# Altium footprint library 430 integreted.PcbLib: 281 footprints (part 12 of 18)
Each footprint in its own frame and in the unit in brackets; x right, y up, seen from the top. Pads: shape width x height; smd on the part's side, far side on the other; paste and mask are expansions set on the pad; w line width, h text height; cw(c..) or ccw(c..) is an arc to the next point about the centre after c.
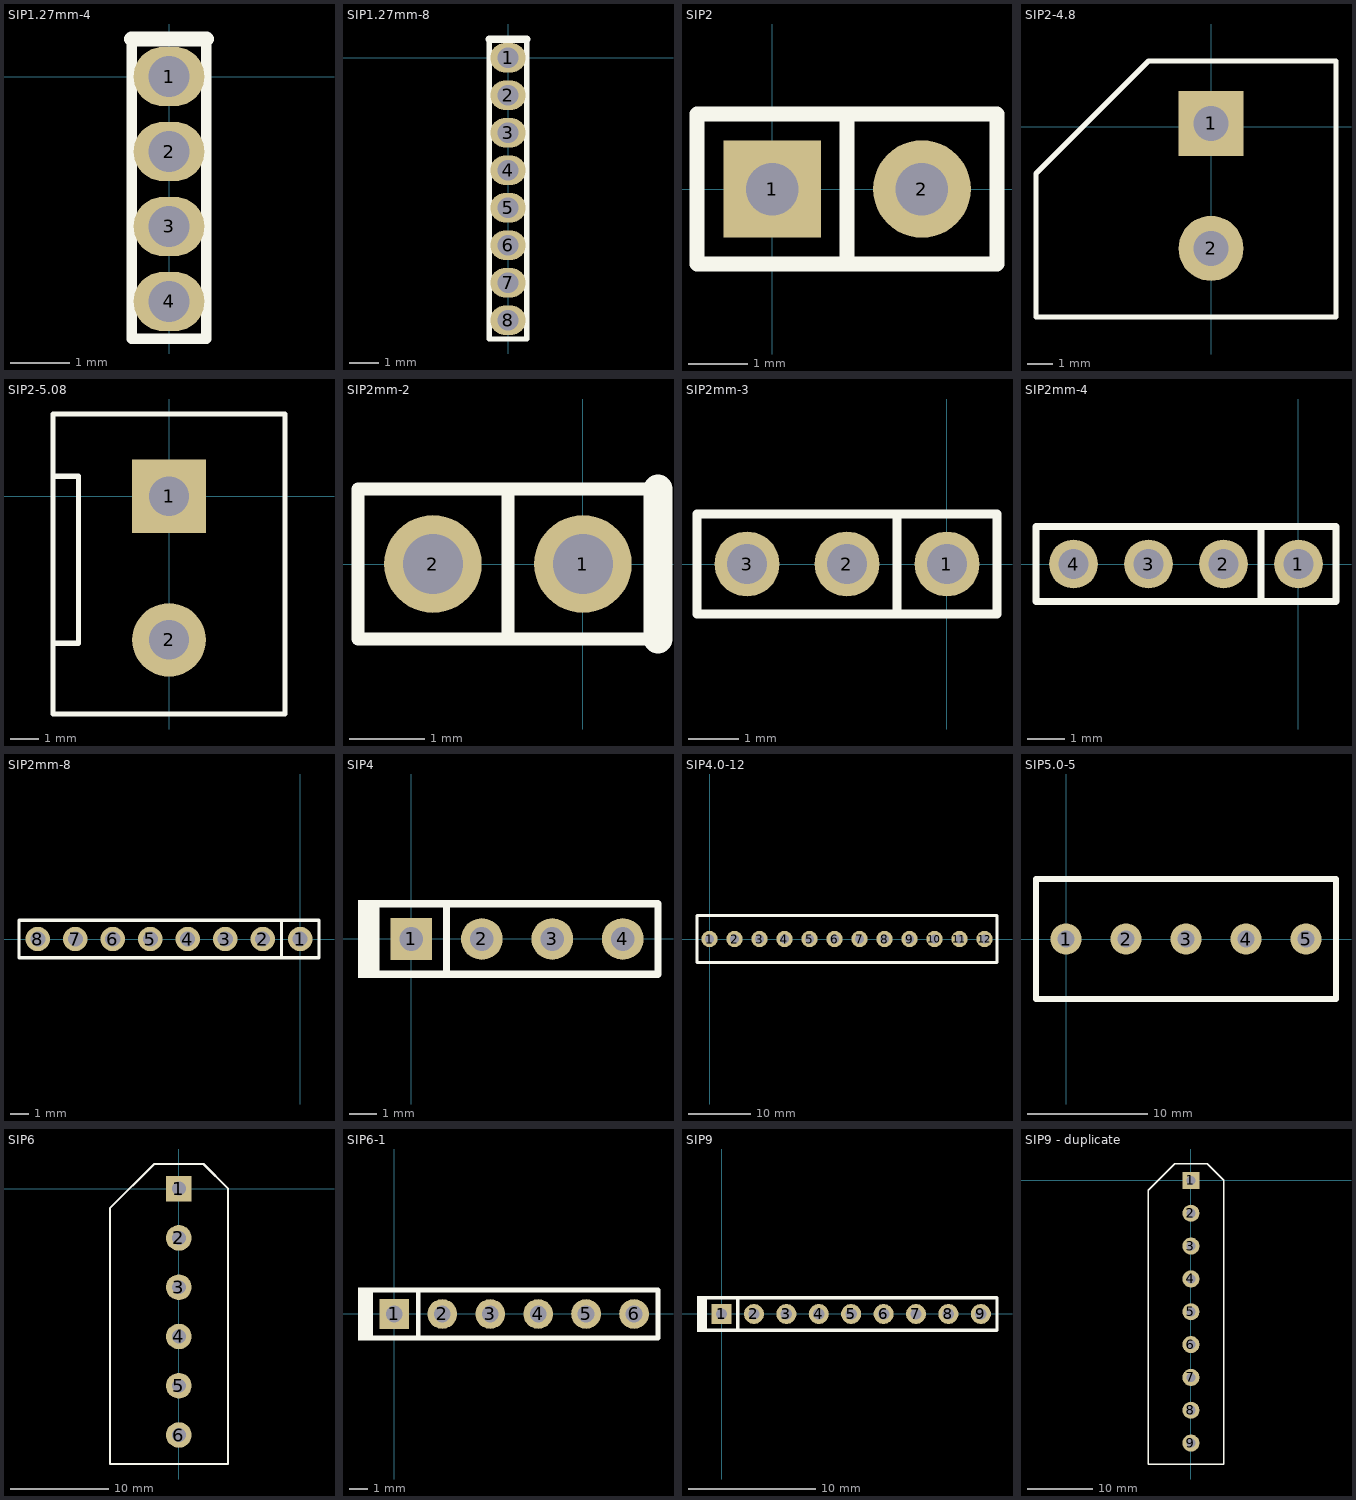
[diagram p11: the footprints below, top view; thin cyan lines are the x and y axes]

## SIP1.27mm-4 [mm]
pads (4):
  oval 1.2x1 hole 0.7: 1(0,0) 2(0,-1.27) 3(0,-2.54) 4(0,-3.81)
Top Overlay:
  lines w0.178: -0.635,0.635 -0.635,-4.445 0.635,-4.445 0.635,0.635
  lines w0.254: -0.635,0.635 0.635,0.635

## SIP1.27mm-8 [mm]
pads (8):
  oval 1.2x1 hole 0.7: 1(0,0) 2(0,-1.27) 3(0,-2.54) 4(0,-3.81) 5(0,-5.08) 6(0,-6.35) 7(0,-7.62) 8(0,-8.89)
Top Overlay:
  lines w0.178: -0.635,0.635 -0.635,-9.525 0.635,-9.525 0.635,0.635
  lines w0.254: -0.635,0.635 0.635,0.635

## SIP2 [mil]
pads (2):
  rect 65x65 hole 35: 1(0,0)
  round 65 hole 35: 2(100,0)
Top Overlay:
  lines w10: 50,-50 50,50 ; -50,-50 -50,50 150,50 150,-50 -50,-50

## SIP2-4.8 [mm]
pads (2):
  rect 2.6x2.6 hole 1.4: 1(0,0.127)
  round 2.6 hole 1.4: 2(0,-4.873)
Top Overlay:
  lines w0.203: -7,-7.62 -7,-1.873 -2.5,2.627 5,2.627 5,-7.62 -7,-7.62

## SIP2-5.08 [mm]
pads (2):
  rect 2.6x2.6 hole 1.397: 1(0,0)
  round 2.6 hole 1.397: 2(0,-5.08)
Top Overlay:
  lines w0.178: -4.1,-5.2 -3.2,-5.2 -3.2,0.7 -4,0.7 ; -4.1,-7.7 -4.1,2.9 4.1,2.9 4.1,-7.7 -4.1,-7.7

## SIP2mm-2 [mm]
pads (2):
  round 1.3 hole 0.8: 1(0,0) 2(-2,0)
Top Overlay:
  lines w0.178: -1,-1 -1,1 ; 1,-1 -3,-1 -3,1 1,1
  lines w0.381: 1,-1 1,1

## SIP2mm-3 [mm]
pads (3):
  round 1.3 hole 0.8: 1(0,0) 2(-2,0) 3(-4,0)
Top Overlay:
  lines w0.178: -1,-1 -1,1 ; -5,-1 1,-1 1,1 -5,1 -5,-1

## SIP2mm-4 [mm]
pads (4):
  round 1.3 hole 0.8: 1(0,0) 2(-2,0) 3(-4,0) 4(-6,0)
Top Overlay:
  lines w0.178: -1,-1 -1,1 ; -7,-1 1,-1 1,1 -7,1 -7,-1

## SIP2mm-8 [mm]
pads (8):
  round 1.3 hole 0.8: 1(0,0) 2(-2,0) 3(-4,0) 4(-6,0) 5(-8,0) 6(-10,0) 7(-12,0) 8(-14,0)
Top Overlay:
  lines w0.178: -1,-1 -1,1 ; -15,-1 1,-1 1,1 -15,1 -15,-1

## SIP4 [mm]
pads (4):
  rect 1.5x1.5 hole 0.85: 1(0,0)
  round 1.5 hole 0.85: 2(2.54,0) 3(5.08,0) 4(7.62,0)
Top Overlay:
  rectangle: -1.925,-1.4 -1.15,1.4
  lines w0.254: 1.27,-1.27 1.27,1.27 ; -1.27,-1.27 8.89,-1.27 8.89,1.27 -1.27,1.27 -1.27,-1.27

## SIP4.0-12 [mm]
pads (12):
  round 2.6 hole 1.4: 1(0,0) 2(4,0) 3(8,0) 4(12,0) 5(16,0) 6(20,0) 7(24,0) 8(28,0) 9(32,0) 10(36,0) 11(40,0) 12(44,0)
Top Overlay:
  lines w0.508: -2,-3.75 -2,3.75 46,3.75 46,-3.75 -2,-3.75

## SIP5.0-5 [mm]
pads (5):
  round 2.6 hole 1.4: 1(0,0) 2(5,0) 3(10,0) 4(15,0) 5(20,0)
Top Overlay:
  lines w0.508: -2.5,-5 -2.5,5 22.5,5 22.5,-5 -2.5,-5

## SIP6 [mm]
pads (6):
  rect 2.6x2.6 hole 1.4: 1(0,0)
  round 2.6 hole 1.4: 2(0,-5) 3(0,-10) 4(0,-15) 5(0,-20) 6(0,-25)
Top Overlay:
  lines w0.203: -7,-27.94 5,-27.94 5,0 2.5,2.5 -2.5,2.5 -7,-2 -7,-27.94

## SIP6-1 [mil] "SIP6-1"
pads (6):
  rect 62x62 hole 35: 1(0,0)
  round 62 hole 35: 2(100,0) 3(200,0) 4(300,0) 5(400,0) 6(500,0)
Top Overlay:
  rectangle: -75.79,-55.12 -45.28,55.12
  lines w10: 50,-50 50,50 ; -50,-50 550,-50 550,50 -50,50 -50,-50

## SIP9 [mil]
pads (9):
  rect 62x62 hole 35: 1(0,0)
  round 62 hole 35: 2(100,0) 3(200,0) 4(300,0) 5(400,0) 6(500,0) 7(600,0) 8(700,0) 9(800,0)
Top Overlay:
  rectangle: -75.79,-55.12 -45.28,55.12
  lines w10: 50,-50 50,50 ; -50,-50 -50,50 850,50 850,-50 -50,-50

## SIP9 - duplicate [mm]
pads (9):
  rect 2.6x2.6 hole 1.397: 1(0,0)
  round 2.6 hole 1.397: 2(0,-5) 3(0,-10) 4(0,-15) 5(0,-20) 6(0,-25) 7(0,-30) 8(0,-35) 9(0,-40)
Top Overlay:
  lines w0.203: -6.5,-43.18 5,-43.18 5,0 2.5,2.5 -2.5,2.5 -6.5,-1.5 -6.5,-43.18